# Altium footprint library LDCN Components.PcbLib: 426 footprints (part 20 of 27)
Each footprint in its own frame and in the unit in brackets; x right, y up, seen from the top. Pads: shape width x height; smd on the part's side, far side on the other; paste and mask are expansions set on the pad; w line width, h text height; cw(c..) or ccw(c..) is an arc to the next point about the centre after c.
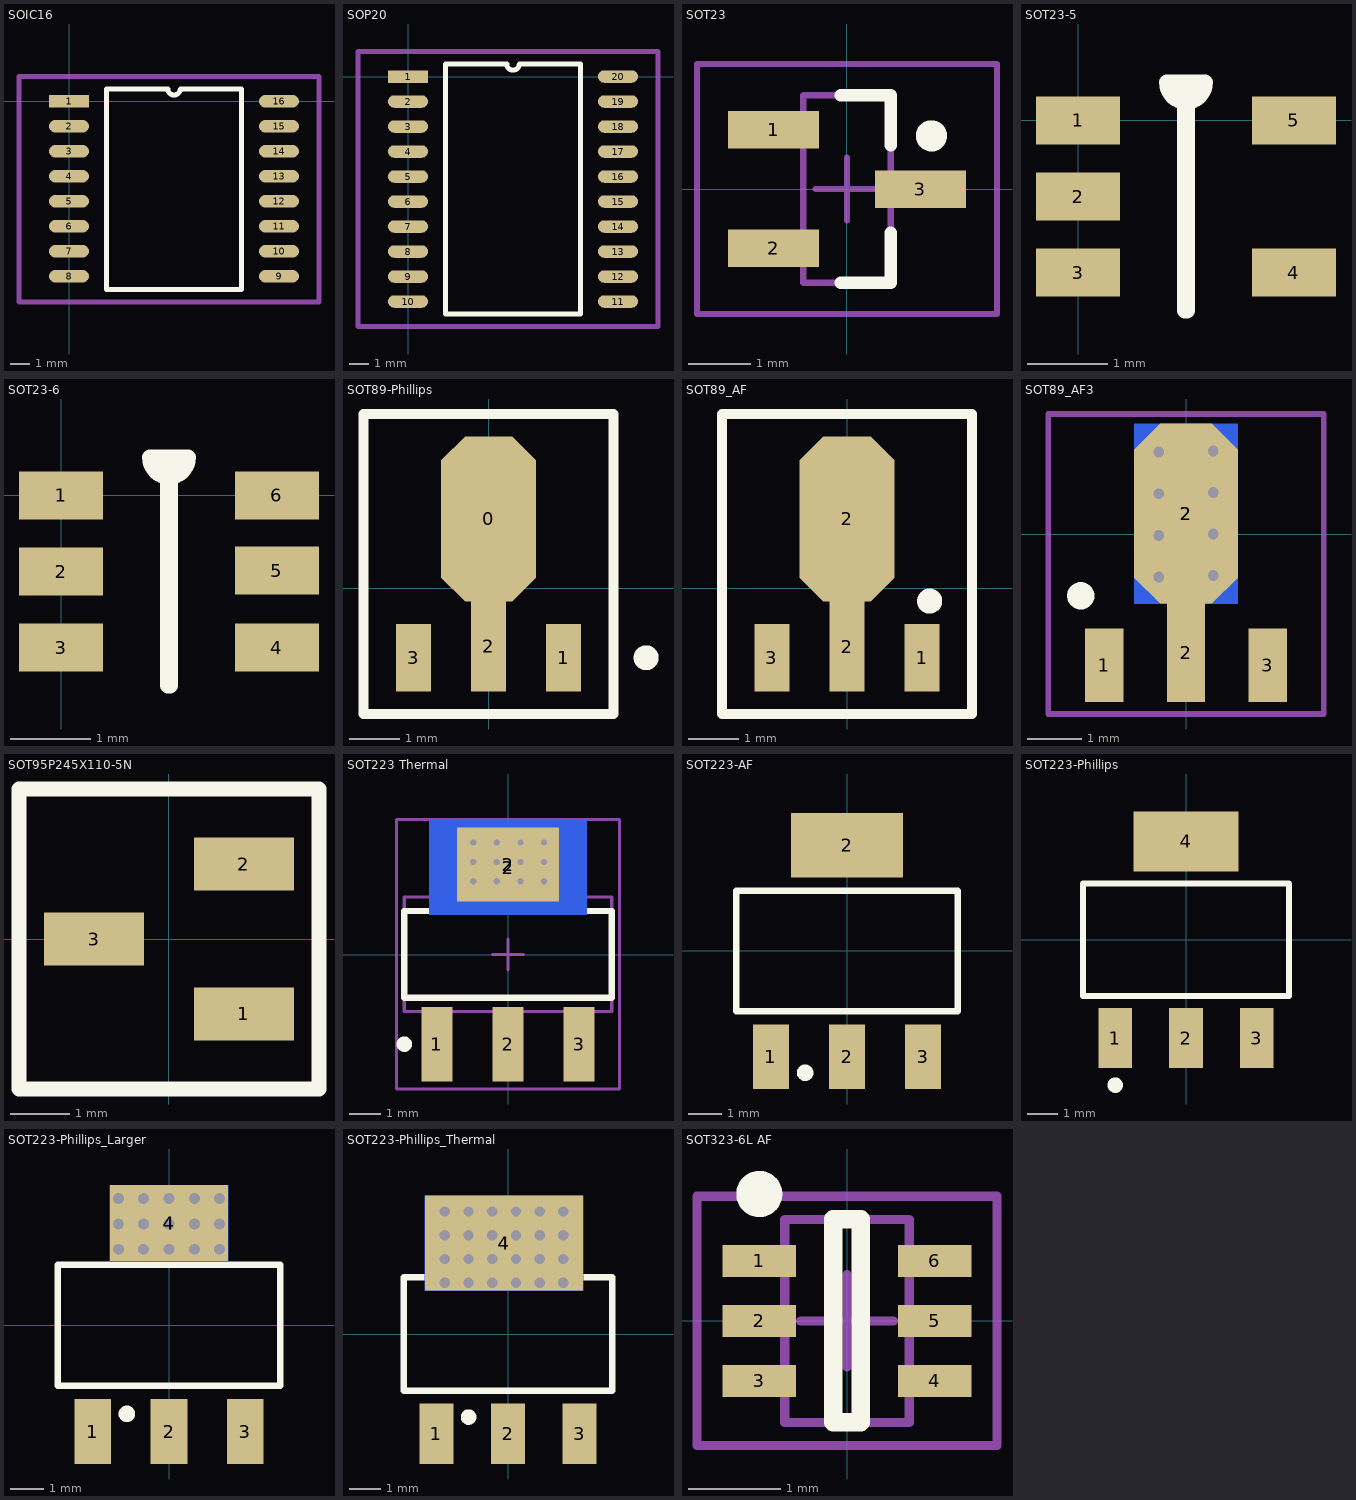
[diagram p19: the footprints below, top view; thin cyan lines are the x and y axes]

## SOIC16 [mil]
pads (16):
  rect 80x25 smd: 1(0,0)
  oval 80x25 smd: 2(0,-50) 3(0,-100) 4(0,-150) 5(0,-200) 6(0,-250) 7(0,-300) 8(0,-350) 9(420,-350) 10(420,-300) 11(420,-250) 12(420,-200) 13(420,-150) 14(420,-100) 15(420,-50) 16(420,0)
Top Overlay:
  lines w10: 75,-376 345,-376 345,25 222.5,25 cw(c210,25) 197.5,25 75,25 75,-376
Mechanical 15:
  lines w10: -100,-401 500,-401 500,50 -100,50 -100,-401

## SOP20 [mil]
pads (20):
  rect 80x25 smd: 1(0,0)
  oval 80x25 smd: 2(0,-50) 3(0,-100) 4(0,-150) 5(0,-200) 6(0,-250) 7(0,-300) 8(0,-350) 9(0,-400) 10(0,-450) 11(420,-450) 12(420,-400) 13(420,-350) 14(420,-300) 15(420,-250) 16(420,-200) 17(420,-150) 18(420,-100) 19(420,-50) 20(420,0)
Top Overlay:
  lines w10: 75,-475 75,25 197.5,25 ccw(c210,25) 222.5,25 345,25 345,-475 75,-475
Mechanical 15:
  lines w10: -100,-500 -100,50 500,50 500,-500 -100,-500

## SOP65P780-38N [mm]

## SOT23 [mm] "SOT23, 3-Leads, Body 2.9x1.3mm, Pitch 0.95mm, Lead Span 2.3mm - Reverse Pinning, IPC Low Density"
height 1.1
pads (3):
  rect 1.45x0.6 smd: 1(-1.175,0.95) 2(-1.175,-0.95) 3(1.175,0)
Top Overlay:
  circle w0.25: c1.35,0.85 r0.125
  lines w0.2: -0.1,-1.5 0.7,-1.5 0.7,-0.7 ; -0.1,1.5 0.7,1.5 0.7,0.7
Mechanical 13:
  lines w0.1: -0.7,-1.5 -0.7,1.5 0.7,1.5 0.7,-1.5 -0.7,-1.5
Mechanical 15:
  lines w0.1: -0.5,0 0.5,0 ; 0,-0.5 0,0.5 ; -2.4,-2 -2.4,2 2.4,2 2.4,-2 -2.4,-2
3D body: height 1.1, standoff 0, extent -0.7,-1.5 0.7,1.5

## SOT23-5 [mm]
pads (5):
  rect 1.05x0.6 smd mask+0.18: 1(0,0) 2(0,-0.95) 3(0,-1.9) 4(2.7,-1.9) 5(2.7,0)
Top Overlay:
  lines w0.2: 1.112,0.475 ccw(c1.35,0.475) 1.587,0.475 1.34,0.475 1.34,-2.375 1.36,-2.375 1.36,0.475 1.112,0.475
3D body "SOT23_5.stp": height 0.92, standoff 0.01, extent -0.24,-2.455 2.965,0.545

## SOT23-6 [mm]
pads (6):
  rect 1.05x0.6 smd mask+0.18: 1(0,0) 2(0,-0.95) 3(0,-1.9) 4(2.7,-1.9) 5(2.7,-0.94) 6(2.7,0)
Top Overlay:
  lines w0.2: 1.112,0.475 ccw(c1.35,0.475) 1.587,0.475 1.34,0.475 1.34,-2.375 1.36,-2.375 1.36,0.475 1.112,0.475
3D body "SOT23_5.stp": height 0.92, standoff 0.01, extent -0.24,-2.455 2.965,0.545

## SOT89-Phillips [mm] "SOT-89; Body 4.6 x 4.25 mm, inc. leads (LxW max); Reverse Pinning"
height 1.6
pads (4):
  oct 1.9x3.3 smd: 0(0,1.388)
  rect 0.7x1.35 smd: 1(1.5,-1.388) 3(-1.5,-1.388)
  rect 0.7x1.8 smd: 2(0,-1.162)
Top Overlay:
  circle w0.25: c3.15,-1.388 r0.125
  lines w0.2: -2.5,-2.512 -2.5,3.487 2.5,3.487 2.5,-2.512 -2.5,-2.512

## SOT89_AF [mm] "SOT-89; Body 4.6 x 4.25 mm, inc. leads (LxW max); Reverse Pinning"
height 1.6
pads (4):
  rect 0.7x1.35 smd: 1(1.5,-1.388) 3(-1.5,-1.388)
  rect 0.7x1.8 smd: 2(0,-1.163)
  oct 1.9x3.3 smd: 2(0,1.388)
Top Overlay:
  circle w0.25: c1.653,-0.254 r0.125
  lines w0.2: -2.5,-2.512 -2.5,3.487 2.5,3.487 2.5,-2.512 -2.5,-2.512

## SOT89_AF3 [mm] "SOT-89, Body 4.6 x 4.25 mm, inc. leads (LxW)"
height 1.6
pads (13):
  rect 0.7x1.35 smd: 1(-1.5,-2.404) 3(1.5,-2.404)
  round 0 hole 0.2: 2(-0.5,-0.786) 2(-0.5,-0.024) 2(-0.5,0.738) 2(-0.5,1.5) 2(0.5,-0.762) 2(0.5,0) 2(0.5,0.762) 2(0.5,1.524)
  rect 0.7x1.8 smd: 2(0,-2.178)
  oct 1.9x3.3 smd: 2(0,0.372)
  rect 1.905x3.302 smd far side: 2(0,0.372)
Top Overlay:
  circle w0.25: c-1.93,-1.134 r0.125
Mechanical 15:
  lines w0.102: -2.525,-3.3 2.525,-3.3 2.525,2.2 -2.525,2.2 -2.525,-3.3
3D body: height 2.38, standoff 0, extent -2.348,-1.27 2.311,1.27

## SOT95P245X110-5N [mm] "SOT23, 5-Leads, Body 3.0x2.6mm (max), Pitch 0.95mm, IPC Medium Density"
height 1.1
pads (3):
  rect 1.7x0.9 smd: 1(1.27,-1.27) 2(1.27,1.27) 3(-1.27,0)
Top Overlay:
  lines w0.254: -2.54,-2.54 -2.54,2.54 2.54,2.54 2.54,-2.54 -2.54,-2.54

## SOT223 Thermal [mm] "IPC 7352 SOT-223 with Thermal Pad"
height 1.8
pads (17):
  rect 1x2.4 smd: 1(-2.301,-2.879) 2(-0.001,-2.879) 3(2.299,-2.879)
  round 0 hole 0.2: 2(-1.124,2.38) 2(-1.124,3) 2(-1.124,3.635) 2(-0.362,2.38) 2(-0.362,3) 2(-0.362,3.635) 2(0.4,2.38) 2(0.4,3) 2(0.4,3.635) 2(1.162,2.38) 2(1.162,3) 2(1.162,3.635)
  rect 3.3x2.4 smd: 2(-0.001,2.921)
  rect 5.08x3.048 smd far side: 2(0,2.821)
Top Overlay:
  circle w0.25: c-3.351,-2.879 r0.125
  lines w0.2: -3.351,-1.379 3.349,-1.379 3.349,1.421 -3.351,1.421 -3.351,-1.379
Mechanical 13:
  lines w0.1: -3.351,-1.829 3.349,-1.829 3.349,1.871 -3.351,1.871 -3.351,-1.829
Mechanical 15:
  lines w0.1: -0.501,0.021 0.499,0.021 ; -0.001,-0.479 -0.001,0.521 ; -3.601,-4.329 3.599,-4.329 3.599,4.371 -3.601,4.371 -3.601,-4.329
3D body: height 1.8, standoff 0, extent -3.351,-1.829 3.349,1.871

## SOT223-AF [mm] "Pin2 and Tab are designated as pin2"
height 1.8
pads (4):
  rect 1.1x1.95 smd: 1(-2.3,-3.2) 2(0,-3.2) 3(2.3,-3.2)
  rect 3.4x1.95 smd: 2(0,3.2)
Top Overlay:
  circle w0.25: c-1.268,-3.683 r0.125
  lines w0.2: -3.35,-1.825 -3.35,1.825 3.35,1.825 3.35,-1.825 -3.35,-1.825

## SOT223-Phillips [mm] "SOT-223/SC-73; 4 Leads; Body 6.7 x 7.3 mm, inc. leads (LxW max)"
height 1.8
pads (4):
  rect 1.1x1.95 smd: 1(-2.3,-3.2) 2(0,-3.2) 3(2.3,-3.2)
  rect 3.4x1.95 smd: 4(0,3.2)
Top Overlay:
  circle w0.25: c-2.3,-4.725 r0.125
  lines w0.2: -3.35,-1.825 3.35,-1.825 3.35,1.825 -3.35,1.825 -3.35,-1.825

## SOT223-Phillips_Larger [mil] "SOT-223/SC-73; 4 Leads; Body 6.7 x 7.3 mm, inc. leads (LxW max)"
height 70.87
pads (20):
  rect 43.31x76.77 smd: 1(-90.55,-125.98) 2(0,-125.98) 3(90.55,-125.98)
  round 0 hole 13: 4(-60,90) 4(-60,120) 4(-60,150) 4(-30,90) 4(-30,120) 4(-30,150) 4(0,90) 4(0,120) 4(0,150) 4(30,90) 4(30,120) 4(30,150) 4(60,90) 4(60,120) 4(60,150)
  rect 140x90 smd: 4(0,120.98)
  rect 140x90 smd far side: 4(0,120.98)
Top Overlay:
  circle w9.84: c-49.92,-105 r4.92
  lines w7.87: -131.89,-71.85 131.89,-71.85 131.89,71.85 -131.89,71.85 -131.89,-71.85

## SOT223-Phillips_Thermal [mil] "SOT-223/SC-73; 4 Leads; Body 6.7 x 7.3 mm, inc. leads (LxW max)"
height 70.87
pads (29):
  rect 43.31x76.77 smd: 1(-90.55,-125.98) 2(0,-125.98) 3(90.55,-125.98)
  round 0 hole 13: 4(-80,65) 4(-80,95) 4(-80,125) 4(-80,155) 4(-50,65) 4(-50,95) 4(-50,125) 4(-50,155) 4(-20,65) 4(-20,95) 4(-20,125) 4(-20,155) 4(10,65) 4(10,95) 4(10,125) 4(10,155) 4(40,65) 4(40,95) 4(40,125) 4(40,155) 4(70,65) 4(70,95) 4(70,125) 4(70,155)
  rect 200x120 smd: 4(-5,115)
  rect 200x120 smd far side: 4(-5,115)
Top Overlay:
  circle w9.84: c-49.92,-105 r4.92
  lines w7.87: -131.89,-71.85 -131.89,71.85 131.89,71.85 131.89,-71.85 -131.89,-71.85

## SOT323-6L AF [mm] "SOT23, 6-Leads, Body 2.2x2.4mm (max), Pitch 0.65mm, IPC Medium Density"
height 1.1
pads (6):
  rect 0.8x0.35 smd: 1(-0.95,0.65) 2(-0.95,0) 3(-0.95,-0.65) 4(0.95,-0.65) 5(0.95,0) 6(0.95,0.65)
Top Overlay:
  circle w0.25: c-0.95,1.375 r0.125
  lines w0.2: -0.15,-1.1 -0.15,1.1 0.15,1.1 0.15,-1.1 -0.15,-1.1
Mechanical 13:
  lines w0.1: -0.675,-1.1 0.675,-1.1 0.675,1.1 -0.675,1.1 -0.675,-1.1
Mechanical 15:
  lines w0.1: -0.5,0 0.5,0 ; 0,-0.5 0,0.5 ; -1.625,-1.35 1.625,-1.35 1.625,1.35 -1.625,1.35 -1.625,-1.35
3D body: height 1.1, standoff 0, extent -0.675,-1.1 0.675,1.1